# Altium footprint library LUMI_Handy_Soldering_LIB.PcbLib: 562 footprints (part 7 of 36)
Each footprint in its own frame and in the unit in brackets; x right, y up, seen from the top. Pads: shape width x height; smd on the part's side, far side on the other; paste and mask are expansions set on the pad; w line width, h text height; cw(c..) or ccw(c..) is an arc to the next point about the centre after c.
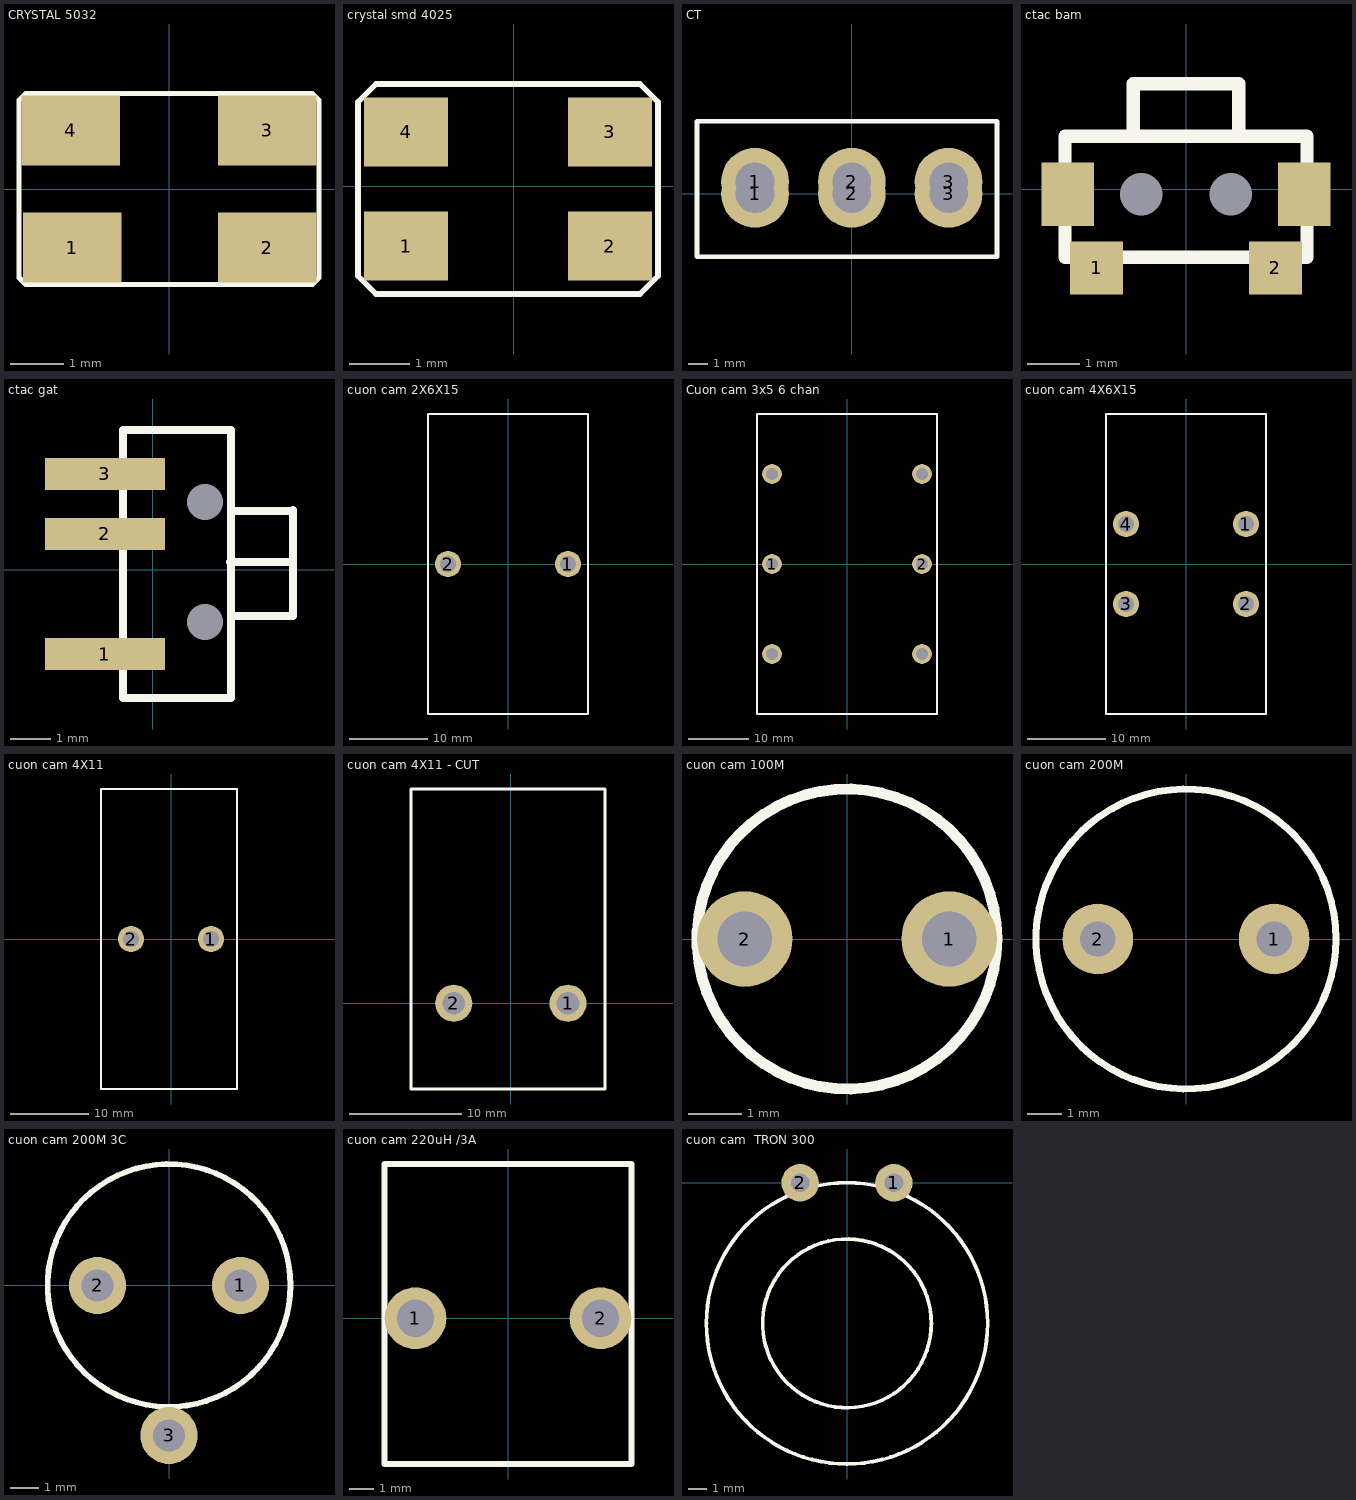
[diagram p6: the footprints below, top view; thin cyan lines are the x and y axes]

## CRYSTAL 5032 [mm]
pads (4):
  rect 1.83x1.3 smd: 1(-1.803,-1.092) 2(1.829,-1.092) 3(1.829,1.092) 4(-1.829,1.092)
Top Overlay:
  lines w0.1: -2.794,-1.651 -2.794,1.651 -2.667,1.778 2.667,1.778 2.794,1.651 2.794,1.524 2.794,-1.651 2.667,-1.778 -2.667,-1.778 -2.794,-1.651
3D body: height 0.9, standoff -0.05, extent -2.5,-1.6 2.5,1.6

## Crystal smd 3225 [mm]

## crystal smd 4025 [mm]
pads (4):
  rect 1.397x1.143 smd: 1(-1.8,-1) 2(1.6,-1) 3(1.6,0.9) 4(-1.8,0.9)
Top Overlay:
  lines w0.1: -2.6,-1.5 -2.3,-1.8 2.1,-1.8 2.4,-1.5 2.4,1.4 2.1,1.7 -2.3,1.7 -2.6,1.4 -2.6,-1.5
3D body: height 0.63, standoff 0, extent -2,-1.3 2,1.2

## CT [mil]
pads (6):
  round 140 hole 80: 1(-200,0) 1(-200,25) 2(0,0) 2(0,25) 3(200,0) 3(200,25)
Top Overlay:
  lines w10: -320,-130 -320,150 300,150 300,-130 -320,-130

## ctac bam [mm] "cong tac bam danh cho remote zigbee"
pads (6):
  rect 1x1 smd: 1(-1.7,-1.5) 2(1.7,-1.5)
  rect 1x1.2 smd: ""(-2.25,-0.1) ""(2.25,-0.1)
  round 0 hole 0.8: ""(-0.85,-0.1) ""(0.85,-0.1)
Top Overlay:
  lines w0.254: -1,1 -1,2 1,2 1,1 ; -2.3,-1.3 2.3,-1.3 2.3,1 -2.3,1 -2.3,-1.3

## ctac gat [mm] "cong tac gat danh cho remote zigbee"
pads (5):
  rect 3x0.8 smd: 1(-1.2,-2.1) 2(-1.2,0.9) 3(-1.2,2.4)
  round 0 hole 0.9: ""(1.3,-1.3) ""(1.3,1.7)
Top Overlay:
  lines w0.2: 1.925,0.2 3.475,0.2 ; 1.95,-1.15 3.5,-1.15 ; 1.95,1.475 3.5,1.475 ; 3.5,-1.1 3.5,1.5 ; -0.75,-3.2 -0.75,3.5 1.95,3.5 1.95,-3.2 -0.75,-3.2

## cuon cam 2X6X15 [mil]
pads (2):
  round 130 hole 80: 1(300,0) 2(-300,0)
Top Overlay:
  lines w10: -400,-750 -400,750 400,750 400,-750 -400,-750

## Cuon cam 3x5 6 chan [mil]
pads (6):
  round 130 hole 80: 1(-492.13,0) 2(492.13,0) ""(-492.13,-590.55) ""(-492.13,590.55) ""(492.13,-590.55) ""(492.13,590.55)
Top Overlay:
  lines w10: -590.55,-984.25 590.55,-984.25 590.55,984.25 -590.55,984.25 -590.55,-984.25

## cuon cam 4X6X15 [mil]
pads (4):
  round 130 hole 80: 1(300,200) 2(300,-200) 3(-300,-200) 4(-300,200)
Top Overlay:
  lines w10: -400,-750 -400,750 400,750 400,-750 -400,-750

## cuon cam 4X11 [mil]
pads (2):
  round 130 hole 80: 1(200,0) 2(-200,0)
Top Overlay:
  lines w10: -350,-750 -350,750 330,750 330,-750 -350,-750
3D body: height 715.1, standoff -1917.24, extent -349.06,-1332.26 330.05,1108.16

## cuon cam 4X11 - CUT [mil]
pads (2):
  round 130 hole 80: 1(200,0) 2(-200,0)
Top Overlay:
  lines w10: -350,-300 -350,750 330,750 330,-300 -350,-300
3D body: height 715.1, standoff -1917.24, extent -349.06,-1332.26 330.05,1108.16

## cuon cam 100M [mil]
pads (2):
  round 70 hole 40: 1(75,0) 2(-75,0)
Top Overlay:
  circle w8: c0,0 r110
3D body: height 305, standoff 5, extent -109.13,-109.78 110,109.79
3D body: height 50, standoff -50, extent -94.84,-19.96 -55,19.96
3D body: height 50, standoff -50, extent 55.16,-19.96 95,19.96

## cuon cam 200M [mil]
pads (2):
  round 80 hole 40: 1(100,0) 2(-100,0)
Top Overlay:
  circle w8: c0,0 r170
3D body: height 295.28, standoff -137.8, extent -173.23,-168.5 173.23,177.96

## cuon cam 200M 3C [mil]
pads (3):
  round 80 hole 45: 1(100,0) 2(-100,0) 3(0,-210)
Top Overlay:
  circle w8: c0,0 r170
3D body: height 295.28, standoff -137.8, extent -173.23,-168.5 173.23,177.96

## cuon cam 220uH /3A [mil]
pads (2):
  round 100 hole 60: 1(-150,0) 2(150,0)
Top Overlay:
  lines w10: -200,-236.22 200,-236.22 200,250 -200,250 -200,-236.22

## cuon cam  TRON 300 [mil]
pads (2):
  round 80 hole 40: 1(100,0) 2(-100,0)
Top Overlay:
  circle w8: c0,-300 r180
  circle w8: c0,-300 r300